# Altium schematic symbol library Analog Devices Data Converters Analog-to-Digital Converters.SchLib: 2404 symbols (part 14 of 213) (continued)
## AD6657BBCZRL (continued)

## AD6659BCPZ-80
designator U?
Dual 12-Bit IF Receiver with Parallel Interface, 80MSPS, -40 to +85 degC, CP-64-4, Pb-Free, Tray; Generic Part Number: AD6659; Manufacturer: Analog Devices; PartNumber: AD6659BCPZ-80; Resolution (Bits): 12; Channels: 2; Throughput Rate (SPS): 80M; Interface: Par; DatasheetVersion: Rev.A; PackageVersion: 051007-C; PackageReference: CP-64-4; PackageDescription: 64-Lead Lead Frame Chip Scale Package [LFCSP_VQ] 9 x 9 mm Body, Very Thin Quad; Supplier 1: Digi-Key; Supplier Part Number 1: AD6659BCPZ-80-ND; Supplier 2: Mouser; Supplier Part Number 2: 584-AD6659BCPZ-80; RoHS: Y; Packing: Tray; Mounting Technology: Surface Mount; Code_JEDEC: MO-220-VMMD-4; ComponentLink1Description: Manufacturer URL; ComponentLink1URL: http://www.analog.com/en/index.html; ComponentLink2Description: Datasheet; ComponentLink2URL: http://www.analog.com/static/imported-files/data_sheets/AD6659.pdf; ComponentLink3Description: Package Specification; ComponentLink3URL: http://www.analog.com/static/imported-files/packages/PKG_PDF/LFCSP(CP)/CP_64_4.pdf; ComponentLink4Description: Product URL; ComponentLink4URL: http://www.analog.com/en/analog-to-digital-converters/ad-converters/ad6659/products/product.html
footprint CP-64-4_N (QFN, 64-Leads, Body 9x9mm, Pitch 0.5mm, Thermal Pad 6.2x6.2mm, IPC Medium Density)
footprint CP-64-4_L (QFN, 64-Leads, Body 9x9mm, Pitch 0.5mm, Thermal Pad 6.2x6.2mm, IPC High Density)
footprint CP-64-4_M (QFN, 64-Leads, Body 9x9mm, Pitch 0.5mm, Thermal Pad 6.2x6.2mm, IPC Low Density)
part A pins: 8 D0B (LSB) (hiz) "Channel B Digital Outputs.  D0B is the LSB.", 9 D1B (hiz) "Channel B Digital Outputs.", 11 D2B (hiz) "Channel B Digital Outputs.", 12 D3B (hiz) "Channel B Digital Outputs.", 13 D4B (hiz) "Channel B Digital Outputs.", 14 D5B (hiz) "Channel B Digital Outputs.", 15 D6B (hiz) "Channel B Digital Outputs.", 16 D7B (hiz) "Channel B Digital Outputs.", 17 D8B (hiz) "Channel B Digital Outputs.", 18 D9B (hiz) "Channel B Digital Outputs.", 20 D10B (hiz) "Channel B Digital Outputs.", 21 D11B (MSB) (hiz) "Channel B Digital Outputs. D11B is the MSB.", 22 ORB (hiz) "Channel B Out-of-Range Digital Output.", 23 DCOB (hiz) "Channel B Data Clock Digital Output.", 24 DCOA (hiz) "Channel A Data Clock Digital Output.", 30 D0A (LSB) (hiz) "Channel A Digital Outputs.  D0A is the LSB.", 31 D1A (hiz) "Channel A Digital Outputs.", 32 D2A (hiz) "Channel A Digital Outputs.", 33 D3A (hiz) "Channel A Digital Outputs.", 34 D4A (hiz) "Channel A Digital Outputs.", 35 D5A (hiz) "Channel A Digital Outputs.", 36 D6A (hiz) "Channel A Digital Outputs.", 38 D7A (hiz) "Channel A Digital Outputs.", 39 D8A (hiz) "Channel A Digital Outputs.", 40 D9A (hiz) "Channel A Digital Outputs.", 41 D10A (hiz) "Channel A Digital Outputs.", 42 D11A (MSB) (hiz) "Channel A Digital Outputs. D11A is the MSB.", 43 ORA (hiz) "Channel A Out-of-Range Digital Output.", 51 VIN+A (in) "Channel A Analog Inputs.", 52 VIN-A (in) "Channel A Analog Inputs.", 61 VIN-B (in) "Channel B Analog Inputs.", 62 VIN+B (in) "Channel B Analog Inputs."
part B pins: 1 CLK+ (in) "Differential Encode Clock. PECL, LVDS, or 1.8 V CMOS inputs.", 2 CLK- (in) "Differential Encode Clock. PECL, LVDS, or 1.8 V CMOS inputs.", 3 SYNC (in) "Digital Input. SYNC input to clock divider. 30 k ohm internal pull-down", 4 NC "Do Not Connect.", 5 NC "Do Not Connect.", 6 NC "Do Not Connect.", 7 NC "Do Not Connect.", 10 DRVDD (power) "Digital Output Driver Supply (1.8 V to 3.3 V).", 19 DRVDD (power) "Digital Output Driver Supply (1.8 V to 3.3 V).", 25 NC "Do Not Connect.", 26 NC "Do Not Connect.", 27 NC "Do Not Connect.", 28 DRVDD (power) "Digital Output Driver Supply (1.8 V to 3.3 V).", 29 NC "Do Not Connect.", 37 DRVDD (power) "Digital Output Driver Supply (1.8 V to 3.3 V).", 44 SDIO/DCS (io) "SPI Data Input/Output (SDIO). The SDIO function provides bidirectional SPI data I/O in SPI mode with a 30 k ohm internal pull-down in SPI mode. The duty cycle stabilizer (DCS pin function) is the static enable input for the (See Datasheet)", 45 SCLK/DFS (in) "SPI Clock (SCLK) Input in SPI Mode/Data Format Select (DFS). 30 k ohm internal pull-down for both SCLK and DFS. The DFS function provides static control of data output format in non-SPI mode. When DFS is high, it equals twos (See Datasheet)", 46 CSB (in) "SPI Chip Select. Active low enable; 30 k ohm internal pull-up.", 47 OEB (in) "Digital Input. When OEB is low, it enables the Channel A and Channel B digital outputs; when OEB is high, the outputs are tristated. 30 k ohm internal pull-down.", 48 PDWN (in) "Digital Input. 30 kohm internal pull-down. When PDWN is high, it powers down the device. When PDWN is low, the device runs in normal operation.", 49 AVDD (power) "1.8 V Analog Supply Pins.", 50 AVDD (power) "1.8 V Analog Supply Pins.", 53 AVDD (power) "1.8 V Analog Supply Pins.", 54 AVDD (power) "1.8 V Analog Supply Pins.", 55 VREF (io) "Voltage Reference Input/Output.", 56 SENSE (in) "Reference Mode Selection.", 57 VCM (out) "Analog output voltage at midsupply to set common mode of the analog inputs.", 58 RBIAS (in) "Sets Analog Current Bias. Connect to a 10 k ohm (1% tolerance) resistor to ground.", 59 AVDD (power) "1.8 V Analog Supply Pins.", 60 AVDD (power) "1.8 V Analog Supply Pins.", 63 AVDD (power) "1.8 V Analog Supply Pins.", 64 AVDD (power) "1.8 V Analog Supply Pins.", 65 EP (power) "Exposed paddle is the only ground connection for the chip. It must be connected to the printed circuit board (PCB) AGND."

## AD6659BCPZRL7-80
designator U?
Dual 12-Bit IF Receiver with Parallel Interface, 80MSPS, -40 to +85 degC, CP-64-4, Pb-Free, Reel; Generic Part Number: AD6659; Manufacturer: Analog Devices; PartNumber: AD6659BCPZRL7-80; Resolution (Bits): 12; Channels: 2; Throughput Rate (SPS): 80M; Interface: Par; DatasheetVersion: Rev.A; PackageVersion: 051007-C; PackageReference: CP-64-4; PackageDescription: 64-Lead Lead Frame Chip Scale Package [LFCSP_VQ] 9 x 9 mm Body, Very Thin Quad; Supplier 1: Digi-Key; Supplier Part Number 1: AD6659BCPZRL7-80-ND; Supplier 2: Mouser; Supplier Part Number 2: 584-AD6659BCPZR7-80; RoHS: Y; Packing: Reel; Mounting Technology: Surface Mount; Code_JEDEC: MO-220-VMMD-4; ComponentLink1Description: Manufacturer URL; ComponentLink1URL: http://www.analog.com/en/index.html; ComponentLink2Description: Datasheet; ComponentLink2URL: http://www.analog.com/static/imported-files/data_sheets/AD6659.pdf; ComponentLink3Description: Package Specification; ComponentLink3URL: http://www.analog.com/static/imported-files/packages/PKG_PDF/LFCSP(CP)/CP_64_4.pdf; ComponentLink4Description: Product URL; ComponentLink4URL: http://www.analog.com/en/analog-to-digital-converters/ad-converters/ad6659/products/product.html
footprint CP-64-4_N (QFN, 64-Leads, Body 9x9mm, Pitch 0.5mm, Thermal Pad 6.2x6.2mm, IPC Medium Density)
footprint CP-64-4_L (QFN, 64-Leads, Body 9x9mm, Pitch 0.5mm, Thermal Pad 6.2x6.2mm, IPC High Density)
footprint CP-64-4_M (QFN, 64-Leads, Body 9x9mm, Pitch 0.5mm, Thermal Pad 6.2x6.2mm, IPC Low Density)
part A pins: 8 D0B (LSB) (hiz) "Channel B Digital Outputs.  D0B is the LSB.", 9 D1B (hiz) "Channel B Digital Outputs.", 11 D2B (hiz) "Channel B Digital Outputs.", 12 D3B (hiz) "Channel B Digital Outputs.", 13 D4B (hiz) "Channel B Digital Outputs.", 14 D5B (hiz) "Channel B Digital Outputs.", 15 D6B (hiz) "Channel B Digital Outputs.", 16 D7B (hiz) "Channel B Digital Outputs.", 17 D8B (hiz) "Channel B Digital Outputs.", 18 D9B (hiz) "Channel B Digital Outputs.", 20 D10B (hiz) "Channel B Digital Outputs.", 21 D11B (MSB) (hiz) "Channel B Digital Outputs. D11B is the MSB.", 22 ORB (hiz) "Channel B Out-of-Range Digital Output.", 23 DCOB (hiz) "Channel B Data Clock Digital Output.", 24 DCOA (hiz) "Channel A Data Clock Digital Output.", 30 D0A (LSB) (hiz) "Channel A Digital Outputs.  D0A is the LSB.", 31 D1A (hiz) "Channel A Digital Outputs.", 32 D2A (hiz) "Channel A Digital Outputs.", 33 D3A (hiz) "Channel A Digital Outputs.", 34 D4A (hiz) "Channel A Digital Outputs.", 35 D5A (hiz) "Channel A Digital Outputs.", 36 D6A (hiz) "Channel A Digital Outputs.", 38 D7A (hiz) "Channel A Digital Outputs.", 39 D8A (hiz) "Channel A Digital Outputs.", 40 D9A (hiz) "Channel A Digital Outputs.", 41 D10A (hiz) "Channel A Digital Outputs.", 42 D11A (MSB) (hiz) "Channel A Digital Outputs. D11A is the MSB.", 43 ORA (hiz) "Channel A Out-of-Range Digital Output.", 51 VIN+A (in) "Channel A Analog Inputs.", 52 VIN-A (in) "Channel A Analog Inputs.", 61 VIN-B (in) "Channel B Analog Inputs.", 62 VIN+B (in) "Channel B Analog Inputs."
part B pins: 1 CLK+ (in) "Differential Encode Clock. PECL, LVDS, or 1.8 V CMOS inputs.", 2 CLK- (in) "Differential Encode Clock. PECL, LVDS, or 1.8 V CMOS inputs.", 3 SYNC (in) "Digital Input. SYNC input to clock divider. 30 k ohm internal pull-down", 4 NC "Do Not Connect.", 5 NC "Do Not Connect.", 6 NC "Do Not Connect.", 7 NC "Do Not Connect.", 10 DRVDD (power) "Digital Output Driver Supply (1.8 V to 3.3 V).", 19 DRVDD (power) "Digital Output Driver Supply (1.8 V to 3.3 V).", 25 NC "Do Not Connect.", 26 NC "Do Not Connect.", 27 NC "Do Not Connect.", 28 DRVDD (power) "Digital Output Driver Supply (1.8 V to 3.3 V).", 29 NC "Do Not Connect.", 37 DRVDD (power) "Digital Output Driver Supply (1.8 V to 3.3 V).", 44 SDIO/DCS (io) "SPI Data Input/Output (SDIO). The SDIO function provides bidirectional SPI data I/O in SPI mode with a 30 k ohm internal pull-down in SPI mode. The duty cycle stabilizer (DCS pin function) is the static enable input for the (See Datasheet)", 45 SCLK/DFS (in) "SPI Clock (SCLK) Input in SPI Mode/Data Format Select (DFS). 30 k ohm internal pull-down for both SCLK and DFS. The DFS function provides static control of data output format in non-SPI mode. When DFS is high, it equals twos (See Datasheet)", 46 CSB (in) "SPI Chip Select. Active low enable; 30 k ohm internal pull-up.", 47 OEB (in) "Digital Input. When OEB is low, it enables the Channel A and Channel B digital outputs; when OEB is high, the outputs are tristated. 30 k ohm internal pull-down.", 48 PDWN (in) "Digital Input. 30 kohm internal pull-down. When PDWN is high, it powers down the device. When PDWN is low, the device runs in normal operation.", 49 AVDD (power) "1.8 V Analog Supply Pins.", 50 AVDD (power) "1.8 V Analog Supply Pins.", 53 AVDD (power) "1.8 V Analog Supply Pins.", 54 AVDD (power) "1.8 V Analog Supply Pins.", 55 VREF (io) "Voltage Reference Input/Output.", 56 SENSE (in) "Reference Mode Selection.", 57 VCM (out) "Analog output voltage at midsupply to set common mode of the analog inputs.", 58 RBIAS (in) "Sets Analog Current Bias. Connect to a 10 k ohm (1% tolerance) resistor to ground.", 59 AVDD (power) "1.8 V Analog Supply Pins.", 60 AVDD (power) "1.8 V Analog Supply Pins.", 63 AVDD (power) "1.8 V Analog Supply Pins.", 64 AVDD (power) "1.8 V Analog Supply Pins.", 65 EP (power) "Exposed paddle is the only ground connection for the chip. It must be connected to the printed circuit board (PCB) AGND."

## AD6672BCPZ-250
designator U?
Single 11-Bit IF Receiver with LVDS Interface, 250MSPS, -40 to +85 degC, CP-32-12, Pb-Free, Tray; Generic Part Number: AD6672; Manufacturer: Analog Devices; PartNumber: AD6672BCPZ-250; Resolution (Bits): 11; Channels: 1; Throughput Rate (SPS): 250M; DatasheetVersion: Rev.0; PackageVersion: 020509-B; PackageReference: CP-32-12; PackageDescription: 32-Lead Lead Frame Chip Scale Package [LFCSP_WQ] 5 x 5 mm Body, Very Very Thin Quad; Supplier 1: Digi-Key; Supplier Part Number 1: AD6672BCPZ-250-ND; Supplier 2: Farnell; Supplier Part Number 2: 2009265; Supplier 3: Newark; Supplier Part Number 3: 55T8938; Supplier 4: Mouser; Supplier Part Number 4: 584-AD6672BCPZ-250; Interface: LVDS; RoHS: Y; Packing: Tray; Mounting Technology: Surface Mount; Code_JEDEC: MO-220-WHHD; ComponentLink1Description: Manufacturer URL; ComponentLink1URL: http://www.analog.com/en/index.html; ComponentLink2Description: Datasheet; ComponentLink2URL: http://www.analog.com/static/imported-files/data_sheets/AD6672.pdf; ComponentLink3Description: Package Specification; ComponentLink3URL: http://www.analog.com/static/imported-files/packages/PKG_PDF/LFCSP(CP)/CP-32/CP_32_12.pdf; ComponentLink4Description: Product URL; ComponentLink4URL: http://www.analog.com/en/analog-to-digital-converters/ad-converters/ad6672/products/product.html
footprint CP-32-12_N (QFN, 32-Leads, Body 5x5mm, Pitch 0.5mm, Thermal Pad 2.6x2.6mm, IPC Medium Density)
footprint CP-32-12_L (QFN, 32-Leads, Body 5x5mm, Pitch 0.5mm, Thermal Pad 2.6x2.6mm, IPC High Density)
footprint CP-32-12_M (QFN, 32-Leads, Body 5x5mm, Pitch 0.5mm, Thermal Pad 2.6x2.6mm, IPC Low Density)
pins: 1 CLK+ (in) "ADC Clock Input--True.", 2 CLK- (in) "ADC Clock Input--Complement.", 3 AVDD (power) "Analog Power Supply (1.8 V Nominal).", 4 OR- (hiz) "Overrange indicator--Complement.", 5 OR+ (hiz) "Overrange indicator--True.", 6 0/D0- (LSB) (hiz) "DDR LVDS Output Data 0--Complement. The output bit on the rising edge of the data clock output (DCO) from this output is always a Logic 0 (see Figure 2).", 7 0/D0+ (LSB) (hiz) "DDR LVDS Output Data 0--True. The output bit on the rising edge of the data clock output (DCO) from this output is always a Logic 0 (see Figure 2).", 8 DRVDD (power) "Digital Output Driver Supply (1.8 V Nominal).", 9 D1-/D2- (hiz) "DDR LVDS Output Data 1/2--Complement.", 10 D1+/D2+ (hiz) "DDR LVDS Output Data 1/2--True.", 11 D3-/D4- (hiz) "DDR LVDS Output Data 3/4--Complement.", 12 D3+/D4+ (hiz) "DDR LVDS Output Data 3/4--True.", 13 D5-/D6- (hiz) "DDR LVDS Output Data 5/6--Complement.", 14 D5+/D6+ (hiz) "DDR LVDS Output Data 5/6--True.", 15 D7-/D8- (hiz) "DDR LVDS Output Data 7/8--Complement.", 16 D7+/D8+ (hiz) "DDR LVDS Output Data 7/8--True.", 17 DRVDD (power) "Digital Output Driver Supply (1.8 V Nominal).", 18 D9-/D10- (MSB) (hiz) "DDR LVDS Output Data 9/10--Complement.", 19 D9+/D10+ (MSB) (hiz) "DDR LVDS Output Data 9/10--True.", 20 DCO- (hiz) "LVDS Data Clock Output--Complement.", 21 DCO+ (hiz) "LVDS Data Clock Output--True.", 22 SDIO (io) "SPI Serial Data I/O.", 23 SCLK (in) "SPI Serial Clock.", 24 CSB (in) "SPI Chip Select (Active Low).", 25 DNC "Do Not Connect. Do not connect to this pin.", 26 VCM (out) "Common-Mode Level Bias Output for Analog Inputs. This pin should be decoupled to ground using a 0.1 uF capacitor.", 27 AVDD (power) "Analog Power Supply (1.8 V Nominal).", 28 AVDD (power) "Analog Power Supply (1.8 V Nominal).", 29 VIN- (in) "Differential Analog Input Pin (-).", 30 VIN+ (in) "Differential Analog Input Pin (+).", 31 AVDD (power) "Analog Power Supply (1.8 V Nominal).", 32 AVDD (power) "Analog Power Supply (1.8 V Nominal).", 33 EP (power) "Analog Ground. The exposed thermal paddle on the bottom of the package provides the analog ground for the part. This exposed paddle must be connected to ground for proper operation."

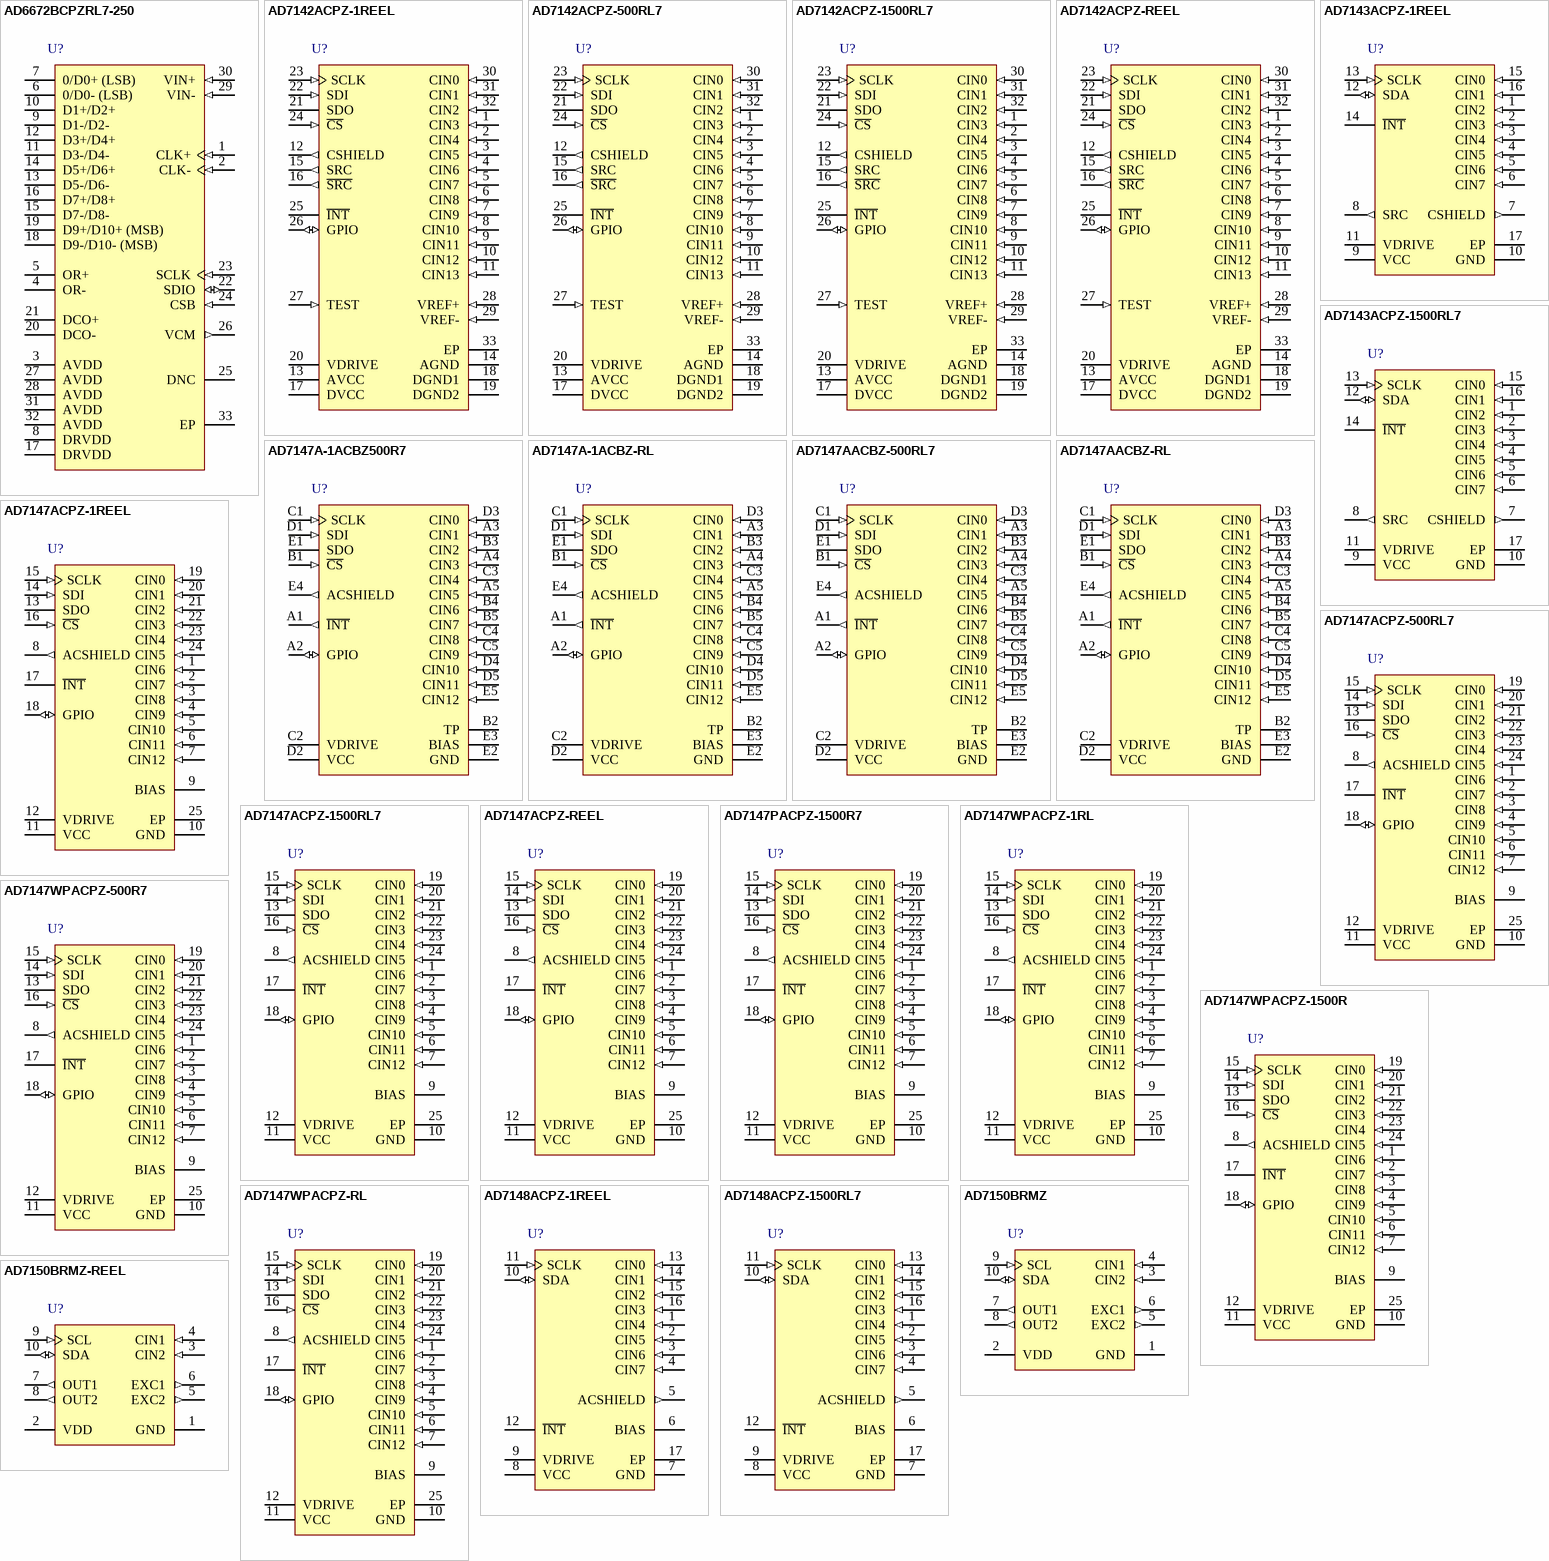
[diagram p13: symbols AD6672BCPZRL7-250 to AD7150BRMZ-REEL]

## AD6672BCPZRL7-250
designator U?
Single 11-Bit IF Receiver with LVDS Interface, 250MSPS, -40 to +85 degC, CP-32-12, Pb-Free, Reel; Generic Part Number: AD6672; Manufacturer: Analog Devices; PartNumber: AD6672BCPZRL7-250; Resolution (Bits): 11; Channels: 1; Throughput Rate (SPS): 250M; DatasheetVersion: Rev.0; PackageVersion: 020509-B; PackageReference: CP-32-12; PackageDescription: 32-Lead Lead Frame Chip Scale Package [LFCSP_WQ] 5 x 5 mm Body, Very Very Thin Quad; Supplier 1: Digi-Key; Supplier Part Number 1: AD6672BCPZRL7-250-ND; Supplier 2: Mouser; Supplier Part Number 2: 584-AD6672BCPZR7-250; Interface: LVDS; RoHS: Y; Packing: Reel; Mounting Technology: Surface Mount; Code_JEDEC: MO-220-WHHD; ComponentLink1Description: Manufacturer URL; ComponentLink1URL: http://www.analog.com/en/index.html; ComponentLink2Description: Datasheet; ComponentLink2URL: http://www.analog.com/static/imported-files/data_sheets/AD6672.pdf; ComponentLink3Description: Package Specification; ComponentLink3URL: http://www.analog.com/static/imported-files/packages/PKG_PDF/LFCSP(CP)/CP-32/CP_32_12.pdf; ComponentLink4Description: Product URL; ComponentLink4URL: http://www.analog.com/en/analog-to-digital-converters/ad-converters/ad6672/products/product.html
footprint CP-32-12_N (QFN, 32-Leads, Body 5x5mm, Pitch 0.5mm, Thermal Pad 2.6x2.6mm, IPC Medium Density)
footprint CP-32-12_L (QFN, 32-Leads, Body 5x5mm, Pitch 0.5mm, Thermal Pad 2.6x2.6mm, IPC High Density)
footprint CP-32-12_M (QFN, 32-Leads, Body 5x5mm, Pitch 0.5mm, Thermal Pad 2.6x2.6mm, IPC Low Density)
pins: 1 CLK+ (in) "ADC Clock Input--True.", 2 CLK- (in) "ADC Clock Input--Complement.", 3 AVDD (power) "Analog Power Supply (1.8 V Nominal).", 4 OR- (hiz) "Overrange indicator--Complement.", 5 OR+ (hiz) "Overrange indicator--True.", 6 0/D0- (LSB) (hiz) "DDR LVDS Output Data 0--Complement. The output bit on the rising edge of the data clock output (DCO) from this output is always a Logic 0 (see Figure 2).", 7 0/D0+ (LSB) (hiz) "DDR LVDS Output Data 0--True. The output bit on the rising edge of the data clock output (DCO) from this output is always a Logic 0 (see Figure 2).", 8 DRVDD (power) "Digital Output Driver Supply (1.8 V Nominal).", 9 D1-/D2- (hiz) "DDR LVDS Output Data 1/2--Complement.", 10 D1+/D2+ (hiz) "DDR LVDS Output Data 1/2--True.", 11 D3-/D4- (hiz) "DDR LVDS Output Data 3/4--Complement.", 12 D3+/D4+ (hiz) "DDR LVDS Output Data 3/4--True.", 13 D5-/D6- (hiz) "DDR LVDS Output Data 5/6--Complement.", 14 D5+/D6+ (hiz) "DDR LVDS Output Data 5/6--True.", 15 D7-/D8- (hiz) "DDR LVDS Output Data 7/8--Complement.", 16 D7+/D8+ (hiz) "DDR LVDS Output Data 7/8--True.", 17 DRVDD (power) "Digital Output Driver Supply (1.8 V Nominal).", 18 D9-/D10- (MSB) (hiz) "DDR LVDS Output Data 9/10--Complement.", 19 D9+/D10+ (MSB) (hiz) "DDR LVDS Output Data 9/10--True.", 20 DCO- (hiz) "LVDS Data Clock Output--Complement.", 21 DCO+ (hiz) "LVDS Data Clock Output--True.", 22 SDIO (io) "SPI Serial Data I/O.", 23 SCLK (in) "SPI Serial Clock.", 24 CSB (in) "SPI Chip Select (Active Low).", 25 DNC "Do Not Connect. Do not connect to this pin.", 26 VCM (out) "Common-Mode Level Bias Output for Analog Inputs. This pin should be decoupled to ground using a 0.1 uF capacitor.", 27 AVDD (power) "Analog Power Supply (1.8 V Nominal).", 28 AVDD (power) "Analog Power Supply (1.8 V Nominal).", 29 VIN- (in) "Differential Analog Input Pin (-).", 30 VIN+ (in) "Differential Analog Input Pin (+).", 31 AVDD (power) "Analog Power Supply (1.8 V Nominal).", 32 AVDD (power) "Analog Power Supply (1.8 V Nominal).", 33 EP (power) "Analog Ground. The exposed thermal paddle on the bottom of the package provides the analog ground for the part. This exposed paddle must be connected to ground for proper operation."

## AD7142ACPZ-1REEL
designator U?
Programmable Controller for Capacitance Touch Sensors with I2C/Serial 2-Wire, Serial, SPI Interface, 27.8kSPS, -40 to +85 degC, CP-32-2, Pb-Free, Reel; Generic Part Number: AD7142; Manufacturer: Analog Devices; PartNumber: AD7142ACPZ-1REEL; Resolution (Bits): 16; Channels: 14; Throughput Rate (SPS): 27.8; Interface: I2C/Ser 2-Wire, Ser, SPI; DatasheetVersion: Rev.A; PackageVersion: Jan-2005; PackageReference: CP-32-2; PackageDescription: 32-Lead Lead Frame Chip Scale Package [LFCSP_VQ] 5 x 5 mm Body, Very Thin Quad; Supplier 1: Digi-Key; Supplier Part Number 1: AD7142ACPZ-1REELTR-ND; Supplier 2: Digi-Key; Supplier Part Number 2: AD7142ACPZ-1REELCT-ND; Supplier 3: Digi-Key; Supplier Part Number 3: AD7142ACPZ-1REELDKR-ND; Supplier 4: Mouser; Supplier Part Number 4: 584-AD7142ACPZ-1R; RoHS: Y; Packing: Reel; Mounting Technology: Surface Mount; Code_JEDEC: MO-220-VHHD-2; ComponentLink1Description: Manufacturer URL; ComponentLink1URL: http://www.analog.com/en/index.html; ComponentLink2Description: Datasheet; ComponentLink2URL: http://www.analog.com/static/imported-files/data_sheets/AD7142.pdf; ComponentLink3Description: Package Specification; ComponentLink3URL: http://www.analog.com/static/imported-files/packages/414143737956480539664569CP_32_2.pdf; ComponentLink4Description: Product URL; ComponentLink4URL: http://www.analog.com/en/analog-to-digital-converters/ad-converters/ad7142/products/product.html
footprint CP-32-2_N (QFN, 32-Leads, Body 5x5mm, Pitch 0.5mm, Thermal Pad 3.1x3.1mm, IPC Medium Density)
footprint CP-32-2_L (QFN, 32-Leads, Body 5x5mm, Pitch 0.5mm, Thermal Pad 3.1x3.1mm, IPC High Density)
footprint CP-32-2_M (QFN, 32-Leads, Body 5x5mm, Pitch 0.5mm, Thermal Pad 3.1x3.1mm, IPC Low Density)
pins: 1 CIN3 (in) "Capacitance Sensor Input.", 2 CIN4 (in) "Capacitance Sensor Input.", 3 CIN5 (in) "Capacitance Sensor Input.", 4 CIN6 (in) "Capacitance Sensor Input.", 5 CIN7 (in) "Capacitance Sensor Input.", 6 CIN8 (in) "Capacitance Sensor Input.", 7 CIN9 (in) "Capacitance Sensor Input.", 8 CIN10 (in) "Capacitance Sensor Input.", 9 CIN11 (in) "Capacitance Sensor Input.", 10 CIN12 (in) "Capacitance Sensor Input.", 11 CIN13 (in) "Capacitance Sensor Input.", 12 CSHIELD (out) "CDC Shield Potential Output. Requires 10 nF capacitor to ground. Connect to external shield.", 13 AVCC (power) "CDC Supply Voltage.", 14 AGND (power) "Analog Ground Reference Point for All CDC Circuitry. Tie to analog ground plane.", 15 SRC (out) "CDC Excitation Source Output.", 16 ~{SRC} (out) "Inverted Excitation Source Output.", 17 DVCC (power) "Digital Core Supply Voltage.", 18 DGND1 (power) "Digital Ground.", 19 DGND2 (power) "Digital Ground.", 20 VDRIVE (power) "Serial Interface Operating Voltage Supply.", 21 SDO (hiz) "SPI Serial Data Output.", 22 SDI (in) "SPI Serial Data Input.", 23 SCLK (in) "Clock Input for Serial Interface.", 24 ~{CS} (in) "SPI Chip Select Signal.", 25 ~{INT} (oc) "General-Purpose Open-Drain Interrupt Output. Programmable polarity; requires pull-up resistor.", 26 GPIO (io) "Programmable GPIO.", 27 TEST (in) "Factory Test Pin. Tie to ground.", 28 VREF+ (in) "CDC Positive Reference Input. Normally tied to analog power.", 29 VREF- (in) "CDC Negative Reference Input. Tie to analog ground.", 30 CIN0 (in) "Capacitance Sensor Input.", 31 CIN1 (in) "Capacitance Sensor Input.", 32 CIN2 (in) "Capacitance Sensor Input.", 33 EP (power) "Exposed Paddle."

## AD7142ACPZ-500RL7
designator U?
Programmable Controller for Capacitance Touch Sensors with I2C/Serial 2-Wire, Serial, SPI Interface, 27.8kSPS, -40 to +85 degC, CP-32-2, Pb-Free, Reel; Generic Part Number: AD7142; Manufacturer: Analog Devices; PartNumber: AD7142ACPZ-500RL7; Resolution (Bits): 16; Channels: 14; Throughput Rate (SPS): 27.8; Interface: I2C/Ser 2-Wire, Ser, SPI; DatasheetVersion: Rev.A; PackageVersion: Jan-2005; PackageReference: CP-32-2; PackageDescription: 32-Lead Lead Frame Chip Scale Package [LFCSP_VQ] 5 x 5 mm Body, Very Thin Quad; Supplier 1: Digi-Key; Supplier Part Number 1: AD7142ACPZ-500RL7TR-ND; Supplier 2: Digi-Key; Supplier Part Number 2: AD7142ACPZ-500RL7CT-ND; Supplier 3: Digi-Key; Supplier Part Number 3: AD7142ACPZ-500RL7DKR-ND; Supplier 4: Mouser; Supplier Part Number 4: 584-AD7142ACPZ-500R7; RoHS: Y; Packing: Reel; Mounting Technology: Surface Mount; Code_JEDEC: MO-220-VHHD-2; ComponentLink1Description: Manufacturer URL; ComponentLink1URL: http://www.analog.com/en/index.html; ComponentLink2Description: Datasheet; ComponentLink2URL: http://www.analog.com/static/imported-files/data_sheets/AD7142.pdf; ComponentLink3Description: Package Specification; ComponentLink3URL: http://www.analog.com/static/imported-files/packages/414143737956480539664569CP_32_2.pdf; ComponentLink4Description: Product URL; ComponentLink4URL: http://www.analog.com/en/analog-to-digital-converters/ad-converters/ad7142/products/product.html
footprint CP-32-2_N (QFN, 32-Leads, Body 5x5mm, Pitch 0.5mm, Thermal Pad 3.1x3.1mm, IPC Medium Density)
footprint CP-32-2_L (QFN, 32-Leads, Body 5x5mm, Pitch 0.5mm, Thermal Pad 3.1x3.1mm, IPC High Density)
footprint CP-32-2_M (QFN, 32-Leads, Body 5x5mm, Pitch 0.5mm, Thermal Pad 3.1x3.1mm, IPC Low Density)
pins: 1 CIN3 (in) "Capacitance Sensor Input.", 2 CIN4 (in) "Capacitance Sensor Input.", 3 CIN5 (in) "Capacitance Sensor Input.", 4 CIN6 (in) "Capacitance Sensor Input.", 5 CIN7 (in) "Capacitance Sensor Input.", 6 CIN8 (in) "Capacitance Sensor Input.", 7 CIN9 (in) "Capacitance Sensor Input.", 8 CIN10 (in) "Capacitance Sensor Input.", 9 CIN11 (in) "Capacitance Sensor Input.", 10 CIN12 (in) "Capacitance Sensor Input.", 11 CIN13 (in) "Capacitance Sensor Input.", 12 CSHIELD (out) "CDC Shield Potential Output. Requires 10 nF capacitor to ground. Connect to external shield.", 13 AVCC (power) "CDC Supply Voltage.", 14 AGND (power) "Analog Ground Reference Point for All CDC Circuitry. Tie to analog ground plane.", 15 SRC (out) "CDC Excitation Source Output.", 16 ~{SRC} (out) "Inverted Excitation Source Output.", 17 DVCC (power) "Digital Core Supply Voltage.", 18 DGND1 (power) "Digital Ground.", 19 DGND2 (power) "Digital Ground.", 20 VDRIVE (power) "Serial Interface Operating Voltage Supply.", 21 SDO (hiz) "SPI Serial Data Output.", 22 SDI (in) "SPI Serial Data Input.", 23 SCLK (in) "Clock Input for Serial Interface.", 24 ~{CS} (in) "SPI Chip Select Signal.", 25 ~{INT} (oc) "General-Purpose Open-Drain Interrupt Output. Programmable polarity; requires pull-up resistor.", 26 GPIO (io) "Programmable GPIO.", 27 TEST (in) "Factory Test Pin. Tie to ground.", 28 VREF+ (in) "CDC Positive Reference Input. Normally tied to analog power.", 29 VREF- (in) "CDC Negative Reference Input. Tie to analog ground.", 30 CIN0 (in) "Capacitance Sensor Input.", 31 CIN1 (in) "Capacitance Sensor Input.", 32 CIN2 (in) "Capacitance Sensor Input.", 33 EP (power) "Exposed Paddle."

## AD7142ACPZ-1500RL7
designator U?
Programmable Controller for Capacitance Touch Sensors with I2C/Serial 2-Wire, Serial, SPI Interface, 27.8kSPS, -40 to +85 degC, CP-32-2, Pb-Free, Reel; Generic Part Number: AD7142; Manufacturer: Analog Devices; PartNumber: AD7142ACPZ-1500RL7; Resolution (Bits): 16; Channels: 14; Throughput Rate (SPS): 27.8; Interface: I2C/Ser 2-Wire, Ser, SPI; DatasheetVersion: Rev.A; PackageVersion: Jan-2005; PackageReference: CP-32-2; PackageDescription: 32-Lead Lead Frame Chip Scale Package [LFCSP_VQ] 5 x 5 mm Body, Very Thin Quad; Supplier 1: Digi-Key; Supplier Part Number 1: AD7142ACPZ-1500RL7TR-ND; Supplier 2: Digi-Key; Supplier Part Number 2: AD7142ACPZ-1500RL7CT-ND; Supplier 3: Digi-Key; Supplier Part Number 3: AD7142ACPZ-1500RL7DKR-ND; Supplier 4: Mouser; Supplier Part Number 4: 584-AD7142ACPZ1500R7; RoHS: Y; Packing: Reel; Mounting Technology: Surface Mount; Code_JEDEC: MO-220-VHHD-2; ComponentLink1Description: Manufacturer URL; ComponentLink1URL: http://www.analog.com/en/index.html; ComponentLink2Description: Datasheet; ComponentLink2URL: http://www.analog.com/static/imported-files/data_sheets/AD7142.pdf; ComponentLink3Description: Package Specification; ComponentLink3URL: http://www.analog.com/static/imported-files/packages/414143737956480539664569CP_32_2.pdf; ComponentLink4Description: Product URL; ComponentLink4URL: http://www.analog.com/en/analog-to-digital-converters/ad-converters/ad7142/products/product.html
footprint CP-32-2_N (QFN, 32-Leads, Body 5x5mm, Pitch 0.5mm, Thermal Pad 3.1x3.1mm, IPC Medium Density)
footprint CP-32-2_L (QFN, 32-Leads, Body 5x5mm, Pitch 0.5mm, Thermal Pad 3.1x3.1mm, IPC High Density)
footprint CP-32-2_M (QFN, 32-Leads, Body 5x5mm, Pitch 0.5mm, Thermal Pad 3.1x3.1mm, IPC Low Density)
pins: 1 CIN3 (in) "Capacitance Sensor Input.", 2 CIN4 (in) "Capacitance Sensor Input.", 3 CIN5 (in) "Capacitance Sensor Input.", 4 CIN6 (in) "Capacitance Sensor Input.", 5 CIN7 (in) "Capacitance Sensor Input.", 6 CIN8 (in) "Capacitance Sensor Input.", 7 CIN9 (in) "Capacitance Sensor Input.", 8 CIN10 (in) "Capacitance Sensor Input.", 9 CIN11 (in) "Capacitance Sensor Input.", 10 CIN12 (in) "Capacitance Sensor Input.", 11 CIN13 (in) "Capacitance Sensor Input.", 12 CSHIELD (out) "CDC Shield Potential Output. Requires 10 nF capacitor to ground. Connect to external shield.", 13 AVCC (power) "CDC Supply Voltage.", 14 AGND (power) "Analog Ground Reference Point for All CDC Circuitry. Tie to analog ground plane.", 15 SRC (out) "CDC Excitation Source Output.", 16 ~{SRC} (out) "Inverted Excitation Source Output.", 17 DVCC (power) "Digital Core Supply Voltage.", 18 DGND1 (power) "Digital Ground.", 19 DGND2 (power) "Digital Ground.", 20 VDRIVE (power) "Serial Interface Operating Voltage Supply.", 21 SDO (hiz) "SPI Serial Data Output.", 22 SDI (in) "SPI Serial Data Input.", 23 SCLK (in) "Clock Input for Serial Interface.", 24 ~{CS} (in) "SPI Chip Select Signal.", 25 ~{INT} (oc) "General-Purpose Open-Drain Interrupt Output. Programmable polarity; requires pull-up resistor.", 26 GPIO (io) "Programmable GPIO.", 27 TEST (in) "Factory Test Pin. Tie to ground.", 28 VREF+ (in) "CDC Positive Reference Input. Normally tied to analog power.", 29 VREF- (in) "CDC Negative Reference Input. Tie to analog ground.", 30 CIN0 (in) "Capacitance Sensor Input.", 31 CIN1 (in) "Capacitance Sensor Input.", 32 CIN2 (in) "Capacitance Sensor Input.", 33 EP (power) "Exposed Paddle."

## AD7142ACPZ-REEL
designator U?
Programmable Controller for Capacitance Touch Sensors with I2C/Serial 2-Wire, Serial, SPI Interface, 27.8kSPS, -40 to +85 degC, CP-32-2, Pb-Free, Reel; Generic Part Number: AD7142; Manufacturer: Analog Devices; PartNumber: AD7142ACPZ-REEL; Resolution (Bits): 16; Channels: 14; Throughput Rate (SPS): 27.8; Interface: I2C/Ser 2-Wire, Ser, SPI; DatasheetVersion: Rev.A; PackageVersion: Jan-2005; PackageReference: CP-32-2; PackageDescription: 32-Lead Lead Frame Chip Scale Package [LFCSP_VQ] 5 x 5 mm Body, Very Thin Quad; Supplier 1: Digi-Key; Supplier Part Number 1: AD7142ACPZ-REELTR-ND; Supplier 2: Digi-Key; Supplier Part Number 2: AD7142ACPZ-REELCT-ND; Supplier 3: Digi-Key; Supplier Part Number 3: AD7142ACPZ-REELDKR-ND; Supplier 4: Mouser; Supplier Part Number 4: 584-AD7142ACPZ-R; RoHS: Y; Packing: Reel; Mounting Technology: Surface Mount; Code_JEDEC: MO-220-VHHD-2; ComponentLink1Description: Manufacturer URL; ComponentLink1URL: http://www.analog.com/en/index.html; ComponentLink2Description: Datasheet; ComponentLink2URL: http://www.analog.com/static/imported-files/data_sheets/AD7142.pdf; ComponentLink3Description: Package Specification; ComponentLink3URL: http://www.analog.com/static/imported-files/packages/414143737956480539664569CP_32_2.pdf; ComponentLink4Description: Product URL; ComponentLink4URL: http://www.analog.com/en/analog-to-digital-converters/ad-converters/ad7142/products/product.html
footprint CP-32-2_N (QFN, 32-Leads, Body 5x5mm, Pitch 0.5mm, Thermal Pad 3.1x3.1mm, IPC Medium Density)
footprint CP-32-2_L (QFN, 32-Leads, Body 5x5mm, Pitch 0.5mm, Thermal Pad 3.1x3.1mm, IPC High Density)
footprint CP-32-2_M (QFN, 32-Leads, Body 5x5mm, Pitch 0.5mm, Thermal Pad 3.1x3.1mm, IPC Low Density)
pins: 1 CIN3 (in) "Capacitance Sensor Input.", 2 CIN4 (in) "Capacitance Sensor Input.", 3 CIN5 (in) "Capacitance Sensor Input.", 4 CIN6 (in) "Capacitance Sensor Input.", 5 CIN7 (in) "Capacitance Sensor Input.", 6 CIN8 (in) "Capacitance Sensor Input.", 7 CIN9 (in) "Capacitance Sensor Input.", 8 CIN10 (in) "Capacitance Sensor Input.", 9 CIN11 (in) "Capacitance Sensor Input.", 10 CIN12 (in) "Capacitance Sensor Input.", 11 CIN13 (in) "Capacitance Sensor Input.", 12 CSHIELD (out) "CDC Shield Potential Output. Requires 10 nF capacitor to ground. Connect to external shield.", 13 AVCC (power) "CDC Supply Voltage.", 14 AGND (power) "Analog Ground Reference Point for All CDC Circuitry. Tie to analog ground plane.", 15 SRC (out) "CDC Excitation Source Output.", 16 ~{SRC} (out) "Inverted Excitation Source Output.", 17 DVCC (power) "Digital Core Supply Voltage.", 18 DGND1 (power) "Digital Ground.", 19 DGND2 (power) "Digital Ground.", 20 VDRIVE (power) "Serial Interface Operating Voltage Supply.", 21 SDO (hiz) "SPI Serial Data Output.", 22 SDI (in) "SPI Serial Data Input.", 23 SCLK (in) "Clock Input for Serial Interface.", 24 ~{CS} (in) "SPI Chip Select Signal.", 25 ~{INT} (oc) "General-Purpose Open-Drain Interrupt Output. Programmable polarity; requires pull-up resistor.", 26 GPIO (io) "Programmable GPIO.", 27 TEST (in) "Factory Test Pin. Tie to ground.", 28 VREF+ (in) "CDC Positive Reference Input. Normally tied to analog power.", 29 VREF- (in) "CDC Negative Reference Input. Tie to analog ground.", 30 CIN0 (in) "Capacitance Sensor Input.", 31 CIN1 (in) "Capacitance Sensor Input.", 32 CIN2 (in) "Capacitance Sensor Input.", 33 EP (power) "Exposed Paddle."